# Altium footprint library Circuitos Integrados.PcbLib: 81 footprints (part 2 of 6)
Each footprint in its own frame and in the unit in brackets; x right, y up, seen from the top. Pads: shape width x height; smd on the part's side, far side on the other; paste and mask are expansions set on the pad; w line width, h text height; cw(c..) or ccw(c..) is an arc to the next point about the centre after c.
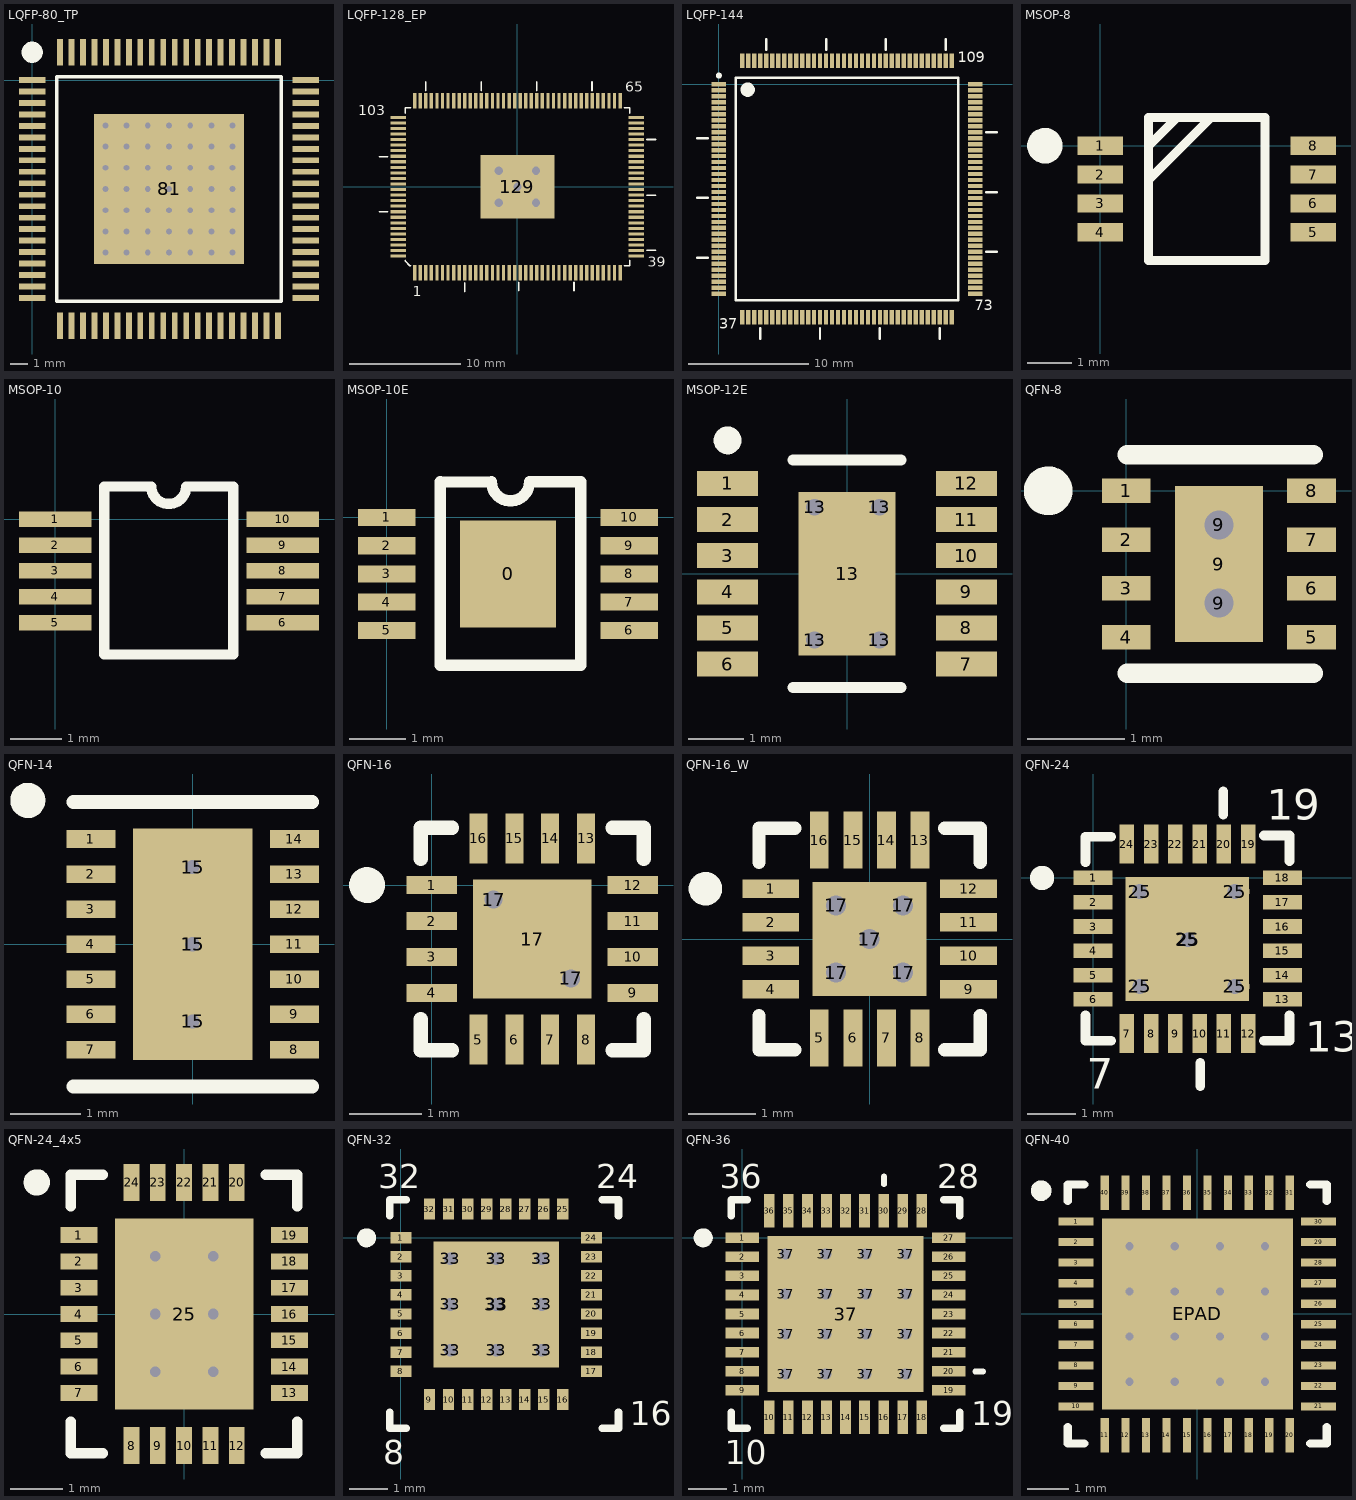
[diagram p1: the footprints below, top view; thin cyan lines are the x and y axes]

## LQFP-80_TP [mm] "LQFP, 80-Leads, Body 16,3x16,3mm (max), Pitch 0,65mm, IPC Medium Density"
height 1.6
pads (81):
  rect 1.5x0.33 smd: 1(0,0) 2(0,-0.65) 3(0,-1.3) 4(0,-1.95) 5(0,-2.6) 6(0,-3.25) 7(0,-3.9) 8(0,-4.55) 9(0,-5.2) 10(0,-5.85) 11(0,-6.5) 12(0,-7.15) 13(0,-7.8) 14(0,-8.45) 15(0,-9.1) 16(0,-9.75) 17(0,-10.4) 18(0,-11.05) 19(0,-11.7) 20(0,-12.35) 41(15.5,-12.35) 42(15.5,-11.7) 43(15.5,-11.05) 44(15.5,-10.4) 45(15.5,-9.75) 46(15.5,-9.1) 47(15.5,-8.45) 48(15.5,-7.8) 49(15.5,-7.15) 50(15.5,-6.5) 51(15.5,-5.85) 52(15.5,-5.2) 53(15.5,-4.55) 54(15.5,-3.9) 55(15.5,-3.25) 56(15.5,-2.6) 57(15.5,-1.95) 58(15.5,-1.3) 59(15.5,-0.65) 60(15.5,0)
  rect 0.33x1.5 smd: 21(1.575,-13.925) 22(2.225,-13.925) 23(2.875,-13.925) 24(3.525,-13.925) 25(4.175,-13.925) 26(4.825,-13.925) 27(5.475,-13.925) 28(6.125,-13.925) 29(6.775,-13.925) 30(7.425,-13.925) 31(8.075,-13.925) 32(8.725,-13.925) 33(9.375,-13.925) 34(10.025,-13.925) 35(10.675,-13.925) 36(11.325,-13.925) 37(11.975,-13.925) 38(12.625,-13.925) 39(13.275,-13.925) 40(13.925,-13.925) 61(13.925,1.575) 62(13.275,1.575) 63(12.625,1.575) 64(11.975,1.575) 65(11.325,1.575) 66(10.675,1.575) 67(10.025,1.575) 68(9.375,1.575) 69(8.725,1.575) 70(8.075,1.575) 71(7.425,1.575) 72(6.775,1.575) 73(6.125,1.575) 74(5.475,1.575) 75(4.825,1.575) 76(4.175,1.575) 77(3.525,1.575) 78(2.875,1.575) 79(2.225,1.575) 80(1.575,1.575)
  rect 8.5x8.5 smd paste-100: 81(7.75,-6.175)
via 11.35,-9.775 diameter 0.66 hole 0.33
via 10.15,-9.775 diameter 0.66 hole 0.33
via 8.95,-9.775 diameter 0.66 hole 0.33
via 7.75,-9.775 diameter 0.66 hole 0.33
via 6.55,-9.775 diameter 0.66 hole 0.33
via 5.35,-9.775 diameter 0.66 hole 0.33
via 4.15,-9.775 diameter 0.66 hole 0.33
via 11.35,-8.575 diameter 0.66 hole 0.33
via 10.15,-8.575 diameter 0.66 hole 0.33
via 8.95,-8.575 diameter 0.66 hole 0.33
via 7.75,-8.575 diameter 0.66 hole 0.33
via 6.55,-8.575 diameter 0.66 hole 0.33
via 5.35,-8.575 diameter 0.66 hole 0.33
via 4.15,-8.575 diameter 0.66 hole 0.33
via 11.35,-7.375 diameter 0.66 hole 0.33
via 10.15,-7.375 diameter 0.66 hole 0.33
via 8.95,-7.375 diameter 0.66 hole 0.33
via 7.75,-7.375 diameter 0.66 hole 0.33
via 6.55,-7.375 diameter 0.66 hole 0.33
via 5.35,-7.375 diameter 0.66 hole 0.33
via 4.15,-7.375 diameter 0.66 hole 0.33
via 11.35,-6.175 diameter 0.66 hole 0.33
via 10.15,-6.175 diameter 0.66 hole 0.33
via 8.95,-6.175 diameter 0.66 hole 0.33
via 7.75,-6.175 diameter 0.66 hole 0.33
via 6.55,-6.175 diameter 0.66 hole 0.33
via 5.35,-6.175 diameter 0.66 hole 0.33
via 4.15,-6.175 diameter 0.66 hole 0.33
via 11.35,-4.975 diameter 0.66 hole 0.33
via 10.15,-4.975 diameter 0.66 hole 0.33
via 8.95,-4.975 diameter 0.66 hole 0.33
via 7.75,-4.975 diameter 0.66 hole 0.33
via 6.55,-4.975 diameter 0.66 hole 0.33
via 5.35,-4.975 diameter 0.66 hole 0.33
via 4.15,-4.975 diameter 0.66 hole 0.33
via 11.35,-3.775 diameter 0.66 hole 0.33
via 10.15,-3.775 diameter 0.66 hole 0.33
via 8.95,-3.775 diameter 0.66 hole 0.33
via 7.75,-3.775 diameter 0.66 hole 0.33
via 6.55,-3.775 diameter 0.66 hole 0.33
via 5.35,-3.775 diameter 0.66 hole 0.33
via 4.15,-3.775 diameter 0.66 hole 0.33
via 11.35,-2.575 diameter 0.66 hole 0.33
via 10.15,-2.575 diameter 0.66 hole 0.33
via 8.95,-2.575 diameter 0.66 hole 0.33
via 7.75,-2.575 diameter 0.66 hole 0.33
via 6.55,-2.575 diameter 0.66 hole 0.33
via 5.35,-2.575 diameter 0.66 hole 0.33
via 4.15,-2.575 diameter 0.66 hole 0.33
Top Overlay:
  circle w0.6: c0,1.575 r0.3
  lines w0.2: 1.4,-12.525 14.1,-12.525 14.1,0.175 1.4,0.175 1.4,-12.525
Top Paste:
  rectangle: 8.95,-9.775 11.35,-7.375
  rectangle: 4.15,-9.775 6.55,-7.375
  rectangle: 6.55,-7.375 8.95,-4.975
  rectangle: 8.95,-4.975 11.35,-2.575
  rectangle: 4.15,-4.975 6.55,-2.575
3D body "LQFP-80 14x14.STEP": height 1.6, standoff 0.01, extent -0.254,-14.177 15.755,1.832

## LQFP-128_EP [mil]
height 62.99
pads (129):
  rect 12x55 smd: 1(-364.5,-304.5) 2(-344.8,-304.5) 3(-325.1,-304.5) 4(-305.4,-304.5) 5(-285.7,-304.5) 6(-266,-304.5) 7(-246.3,-304.5) 8(-226.6,-304.5) 9(-206.9,-304.5) 10(-187.2,-304.5) 11(-167.5,-304.5) 12(-147.8,-304.5) 13(-128.1,-304.5) 14(-108.4,-304.5) 15(-88.7,-304.5) 16(-69,-304.5) 17(-49.3,-304.5) 18(-29.6,-304.5) 19(-9.9,-304.5) 20(9.8,-304.5) 21(29.5,-304.5) 22(49.2,-304.5) 23(68.9,-304.5) 24(88.6,-304.5) 25(108.3,-304.5) 26(128,-304.5) 27(147.7,-304.5) 28(167.4,-304.5) 29(187.1,-304.5) 30(206.8,-304.5) 31(226.5,-304.5) 32(246.2,-304.5) 33(265.9,-304.5) 34(285.6,-304.5) 35(305.3,-304.5) 36(325,-304.5) 37(344.7,-304.5) 38(364.4,-304.5) 65(364.4,304.5) 66(344.7,304.5) 67(325,304.5) 68(305.3,304.5) 69(285.6,304.5) 70(265.9,304.5) 71(246.2,304.5) 72(226.5,304.5) 73(206.8,304.5) 74(187.1,304.5) 75(167.4,304.5) 76(147.7,304.5) 77(128,304.5) 78(108.3,304.5) 79(88.6,304.5) 80(68.9,304.5) 81(49.2,304.5) 82(29.5,304.5) 83(9.8,304.5) 84(-9.9,304.5) 85(-29.6,304.5) 86(-49.3,304.5) 87(-69,304.5) 88(-88.7,304.5) 89(-108.4,304.5) 90(-128.1,304.5) 91(-147.8,304.5) 92(-167.5,304.5) 93(-187.2,304.5) 94(-206.9,304.5) 95(-226.6,304.5) 96(-246.3,304.5) 97(-266,304.5) 98(-285.7,304.5) 99(-305.4,304.5) 100(-325.1,304.5) 101(-344.8,304.5) 102(-364.5,304.5)
  rect 55x11 smd: 39(422.5,-246.3) 40(422.5,-226.6) 41(422.5,-206.9) 42(422.5,-187.2) 43(422.5,-167.5) 44(422.5,-147.8) 45(422.5,-128.1) 46(422.5,-108.4) 47(422.5,-88.7) 48(422.5,-69) 49(422.5,-49.3) 50(422.5,-29.6) 51(422.5,-9.9) 52(422.5,9.8) 53(422.5,29.5) 54(422.5,49.2) 55(422.5,68.9) 56(422.5,88.6) 57(422.5,108.3) 58(422.5,128) 59(422.5,147.7) 60(422.5,167.4) 61(422.5,187.1) 62(422.5,206.8) 63(422.5,226.5) 64(422.5,246.2) 103(-422.5,246.2) 104(-422.5,226.5) 105(-422.5,206.8) 106(-422.5,187.1) 107(-422.5,167.4) 108(-422.5,147.7) 109(-422.5,128) 110(-422.5,108.3) 111(-422.5,88.6) 112(-422.5,68.9) 113(-422.5,49.2) 114(-422.5,29.5) 115(-422.5,9.8) 116(-422.5,-9.9) 117(-422.5,-29.6) 118(-422.5,-49.3) 119(-422.5,-69) 120(-422.5,-88.7) 121(-422.5,-108.4) 122(-422.5,-128.1) 123(-422.5,-147.8) 124(-422.5,-167.5) 125(-422.5,-187.2) 126(-422.5,-206.9) 127(-422.5,-226.6) 128(-422.5,-246.3)
  rect 264x226 smd paste-39370.1: 129(0,0)
via 0,0 diameter 39.37 hole 29.53
via -66,-56.5 diameter 39.37 hole 29.53
via -66,56.5 diameter 39.37 hole 29.53
via 66,-56.5 diameter 39.37 hole 29.53
via 66,56.5 diameter 39.37 hole 29.53
Top Overlay:
  lines w6: -491,-89 -461,-89 ; -490,107 -460,107 ; -398.7,-261 -398.7,-263.5 -381.7,-280.5 -379,-280.5 ; -398.7,261 -398.7,280.5 -379,280.5 ; -325,342 -325,372 ; -187,-372 -187,-342 ; -128,342 -128,372 ; 5,-369.76 5,-339.76 ; 69,342 69,372 ; 201,-368.76 201,-338.76 ; 265,342 265,372 ; 379,-280.5 398.7,-280.5 398.7,-261 ; 379,280.5 398.7,280.5 398.7,261 ; 460,-225 490,-225 ; 460,168 490,168 ; 460.1,-29.9 490.1,-29.9
  text "103" at -566,253 h36
  text "65" at 382,337 h36
  text "39" at 463,-284 h36
  text "1" at -372,-389 h36
Top Paste:
  region: -130,-5 -130,-110 -5,-110 -5,-5
  region: 5,-5 5,-110 130,-110 130,-5
  region: -130,5 -130,110 -5,110 -5,5
  region: 5,110 5,5 130,5 130,110
3D body "User Library-LQFP-144-1.STEP": height 62.99, standoff 1.98, extent -433,-315 441.6,323.28

## LQFP-144 [mm] "TSQFP, 144-Leads, Body 22,2x22,2mm (max), Pitch 0,50mm, IPC Medium Density"
height 1.6
pads (144):
  rect 1.2x0.36 smd: 1(0,0) 2(0,-0.5) 3(0,-1) 4(0,-1.5) 5(0,-2) 6(0,-2.5) 7(0,-3) 8(0,-3.5) 9(0,-4) 10(0,-4.5) 11(0,-5) 12(0,-5.5) 13(0,-6) 14(0,-6.5) 15(0,-7) 16(0,-7.5) 17(0,-8) 18(0,-8.5) 19(0,-9) 20(0,-9.5) 21(0,-10) 22(0,-10.5) 23(0,-11) 24(0,-11.5) 25(0,-12) 26(0,-12.5) 27(0,-13) 28(0,-13.5) 29(0,-14) 30(0,-14.5) 31(0,-15) 32(0,-15.5) 33(0,-16) 34(0,-16.5) 35(0,-17) 36(0,-17.5) 73(21.41,-17.5) 74(21.41,-17) 75(21.41,-16.5) 76(21.41,-16) 77(21.41,-15.5) 78(21.41,-15) 79(21.41,-14.5) 80(21.41,-14) 81(21.41,-13.5) 82(21.41,-13) 83(21.41,-12.5) 84(21.41,-12) 85(21.41,-11.5) 86(21.41,-11) 87(21.41,-10.5) 88(21.41,-10) 89(21.41,-9.5) 90(21.41,-9) 91(21.41,-8.5) 92(21.41,-8) 93(21.41,-7.5) 94(21.41,-7) 95(21.41,-6.5) 96(21.41,-6) 97(21.41,-5.5) 98(21.41,-5) 99(21.41,-4.5) 100(21.41,-4) 101(21.41,-3.5) 102(21.41,-3) 103(21.41,-2.5) 104(21.41,-2) 105(21.41,-1.5) 106(21.41,-1) 107(21.41,-0.5) 108(21.41,0)
  rect 0.36x1.2 smd: 37(1.955,-19.455) 38(2.455,-19.455) 39(2.955,-19.455) 40(3.455,-19.455) 41(3.955,-19.455) 42(4.455,-19.455) 43(4.955,-19.455) 44(5.455,-19.455) 45(5.955,-19.455) 46(6.455,-19.455) 47(6.955,-19.455) 48(7.455,-19.455) 49(7.955,-19.455) 50(8.455,-19.455) 51(8.955,-19.455) 52(9.455,-19.455) 53(9.955,-19.455) 54(10.455,-19.455) 55(10.955,-19.455) 56(11.455,-19.455) 57(11.955,-19.455) 58(12.455,-19.455) 59(12.955,-19.455) 60(13.455,-19.455) 61(13.955,-19.455) 62(14.455,-19.455) 63(14.955,-19.455) 64(15.455,-19.455) 65(15.955,-19.455) 66(16.455,-19.455) 67(16.955,-19.455) 68(17.455,-19.455) 69(17.955,-19.455) 70(18.455,-19.455) 71(18.955,-19.455) 72(19.455,-19.455) 109(19.455,1.955) 110(18.955,1.955) 111(18.455,1.955) 112(17.955,1.955) 113(17.455,1.955) 114(16.955,1.955) 115(16.455,1.955) 116(15.955,1.955) 117(15.455,1.955) 118(14.955,1.955) 119(14.455,1.955) 120(13.955,1.955) 121(13.455,1.955) 122(12.955,1.955) 123(12.455,1.955) 124(11.955,1.955) 125(11.455,1.955) 126(10.955,1.955) 127(10.455,1.955) 128(9.955,1.955) 129(9.455,1.955) 130(8.955,1.955) 131(8.455,1.955) 132(7.955,1.955) 133(7.455,1.955) 134(6.955,1.955) 135(6.455,1.955) 136(5.955,1.955) 137(5.455,1.955) 138(4.955,1.955) 139(4.455,1.955) 140(3.955,1.955) 141(3.455,1.955) 142(2.955,1.955) 143(2.455,1.955) 144(1.955,1.955)
Top Overlay:
  circle w0.25: c0,0.73 r0.125
  circle w0.6: c2.405,-0.45 r0.3
  lines w0.2: 1.405,-18.05 1.405,0.55 20.005,0.55 20.005,-18.05 1.405,-18.05
  lines w0.203: -1.829,-14.496 -0.94,-14.496 ; -1.829,-9.496 -0.94,-9.496 ; -1.829,-4.496 -0.94,-4.496 ; 3.451,-21.284 3.451,-20.395 ; 3.959,2.895 3.959,3.784 ; 8.451,-21.284 8.451,-20.395 ; 8.959,2.895 8.959,3.784 ; 13.451,-21.284 13.451,-20.395 ; 13.959,2.895 13.959,3.784 ; 18.451,-21.284 18.451,-20.395 ; 18.959,2.895 18.959,3.784 ; 22.35,-14.004 23.239,-14.004 ; 22.35,-9.004 23.239,-9.004 ; 22.35,-4.004 23.239,-4.004
  text "37" at 0.025,-20.447 h0.89
  text "73" at 21.361,-18.898 h0.89
  text "109" at 19.964,1.854 h0.89
3D body "SW3dPS-LQFP-144.STEP": height 1.69, standoff -0.01, extent -0.293,-19.754 21.71,2.248

## MSOP-8 [mm]
pads (8):
  rect 1.02x0.41 smd: 1(0,0) 2(0,-0.65) 3(0,-1.3) 4(0,-1.95) 5(4.8,-1.95) 6(4.8,-1.3) 7(4.8,-0.65) 8(4.8,0)
Top Overlay:
  circle w0.4: c-1.25,0 r0.2
  lines w0.203: 1.089,-0.762 2.486,0.635 ; 1.114,0.025 1.724,0.635 ; 1.089,-2.585 1.089,0.635 3.708,0.635 3.708,-2.585 1.089,-2.585
3D body "User Library-EMSOP-8 Natl Semi MUY08A.STEP": height 1.09, standoff -0.01, extent -0.112,-2.492 4.888,0.508

## MSOP-10 [mm]
pads (10):
  rect 1.4x0.3 smd: 1(0,0) 2(0,-0.5) 3(0,-1) 4(0,-1.5) 5(0,-2) 6(4.4,-2) 7(4.4,-1.5) 8(4.4,-1) 9(4.4,-0.5) 10(4.4,0)
Top Overlay:
  lines w0.2: 0.949,0.61 0.949,-2.616 3.439,-2.616 3.439,0.61 ; 0.949,0.631 1.857,0.63 ; 1.858,0.631 ccw(c2.194,0.631) 2.531,0.631 ; 2.53,0.632 3.439,0.631
3D body "User Library-msop-10.STEP": height 1.15, standoff 0, extent -0.24,-2.492 4.66,0.508

## MSOP-10E [mil] "TSOP, 10-Leads, Pitch 0,5mm, Exp PAD, IPC Medium Density"
pads (11):
  rect 66.93x74.8 smd: 0(84.65,-39.37)
  rect 40x12 smd: 1(0,0) 2(0,-19.68) 3(0,-39.37) 4(0,-59.05) 5(0,-78.74) 6(169.29,-78.74) 7(169.29,-59.05) 8(169.29,-39.37) 9(169.29,-19.68) 10(169.29,0)
Top Overlay:
  lines w7.87: 37.38,24 37.38,-103 135.41,-103 135.41,24 ; 37.38,24.84 73.1,24.8 ; 73.14,24.84 ccw(c86.39,24.84) 99.65,24.84 ; 99.6,24.9 135.41,24.84
3D body "User Library-msop-10.STEP": height 45.28, standoff 0, extent -11.81,-98.42 181.1,19.69

## MSOP-12E [mm] "TSOP, 12-Leads, Body 4,1x3,1mm (max), Pitch 0,65mm, Exp PAD, IPC Medium Density"
height 1.1
pads (17):
  rect 1.1x0.45 smd mask+0.076: 1(-2.15,1.625) 2(-2.15,0.975) 3(-2.15,0.325) 4(-2.15,-0.325) 5(-2.15,-0.975) 6(-2.15,-1.625) 7(2.15,-1.625) 8(2.15,-0.975) 9(2.15,-0.325) 10(2.15,0.325) 11(2.15,0.975) 12(2.15,1.625)
  round 0.5 hole 0.3: 13(-0.584,-1.194) 13(-0.584,1.194) 13(0.584,-1.194) 13(0.584,1.194)
  rect 1.75x2.95 smd paste-200 mask+0.076: 13(0,0)
Top Overlay:
  circle w0.25: c-2.15,2.4 r0.125
  lines w0.2: -0.975,-2.05 0.975,-2.05 ; -0.975,2.05 0.975,2.05
Top Paste:
  rectangle: -0.584,-0.94 0.584,0.94
3D body "User Library-msop-12.STEP": height 1.1, standoff 0, extent -2.475,-2.008 2.425,2.032

## QFN-8 [mm] "QFN, 8-Leads, Body 2,1x2,1mm (max), Pitch 0,50mm, IPC Medium Density"
height 0.8
pads (11):
  rect 0.5x0.25 smd mask+0.07: 1(0,0) 2(0,-0.5) 3(0,-1) 4(0,-1.5) 5(1.9,-1.5) 6(1.9,-1) 7(1.9,-0.5) 8(1.9,0)
  round 0.508 hole 0.3: 9(0.95,-1.15) 9(0.95,-0.35)
  rect 0.9x1.6 smd paste-0.12 mask+0.07: 9(0.95,-0.75)
Top Overlay:
  circle w0.25: c-0.8,0 r0.125
  lines w0.2: 0.01,-1.868 1.915,-1.868 ; 0.01,0.368 1.915,0.368
3D body: height 0.8, standoff 0.05, extent -0.038,-1.753 1.968,0.254

## QFN-14 [mm] "QFN, 14-Leads, Body 4,00x3,00mm, Pitch 0,50mm, Thermal Pad 3,30x1,70mm, IPC Medium Density"
height 1
pads (18):
  rect 0.7x0.25 smd: 1(-1.45,1.5) 2(-1.45,1) 3(-1.45,0.5) 4(-1.45,0) 5(-1.45,-0.5) 6(-1.45,-1) 7(-1.45,-1.5) 8(1.45,-1.5) 9(1.45,-1) 10(1.45,-0.5) 11(1.45,0) 12(1.45,0.5) 13(1.45,1) 14(1.45,1.5)
  round 0.5 hole 0.2: 15(0,-1.1) 15(0,0) 15(0,1.1)
  rect 1.7x3.3 smd: 15(0,0)
Top Overlay:
  circle w0.25: c-2.35,2.05 r0.125
  lines w0.2: -1.7,-2.025 1.7,-2.025 ; -1.7,2.025 1.7,2.025
3D body: height 1, standoff 0, extent -1.5,-2 1.5,2

## QFN-16 [mm] "QFN, 16-Leads, Body 3.0x3.0mm (max), Pitch 0.50mm, IPC Medium Density"
height 0.9
pads (19):
  rect 0.7x0.25 smd: 1(0,0) 2(0,-0.5) 3(0,-1) 4(0,-1.5) 9(2.8,-1.5) 10(2.8,-1) 11(2.8,-0.5) 12(2.8,0)
  rect 0.25x0.7 smd: 5(0.65,-2.15) 6(1.15,-2.15) 7(1.65,-2.15) 8(2.15,-2.15) 13(2.15,0.65) 14(1.65,0.65) 15(1.15,0.65) 16(0.65,0.65)
  round 0.559 hole 0.25: 17(0.864,-0.203) 17(1.936,-1.297)
  rect 1.65x1.65 smd paste-0.381: 17(1.4,-0.75)
Top Overlay:
  circle w0.25: c-0.9,0 r0.125
  lines w0.2: -0.15,-1.868 -0.15,-2.3 0.282,-2.3 ; -0.15,0.368 -0.15,0.8 0.282,0.8 ; 2.518,-2.3 2.95,-2.3 2.95,-1.868 ; 2.518,0.8 2.95,0.8 2.95,0.368
3D body "User Library-QFN-16_3x3.STEP": height 0.9, standoff 0, extent -0.127,-2.283 2.915,0.759

## QFN-16_W [mm] "QFN, 16-Leads, Body 3,3x3,3mm (max), Pitch 0,50mm, IPC Medium Density"
height 0.8
pads (22):
  rect 0.85x0.28 smd mask+0.076: 1(-1.475,0.75) 2(-1.475,0.25) 3(-1.475,-0.25) 4(-1.475,-0.75) 9(1.475,-0.75) 10(1.475,-0.25) 11(1.475,0.25) 12(1.475,0.75)
  rect 0.28x0.85 smd mask+0.076: 5(-0.75,-1.475) 6(-0.25,-1.475) 7(0.25,-1.475) 8(0.75,-1.475) 13(0.75,1.475) 14(0.25,1.475) 15(-0.25,1.475) 16(-0.75,1.475)
  round 0.559 hole 0.3: 17(-0.5,-0.5) 17(-0.5,0.5) 17(0,0) 17(0.5,-0.5) 17(0.5,0.5)
  rect 1.7x1.7 smd paste-100 mask+0.076: 17(0,0)
Top Overlay:
  circle w0.25: c-2.45,0.75 r0.125
  lines w0.2: -1.65,-1.143 -1.65,-1.65 -1.118,-1.65 ; -1.65,1.143 -1.65,1.65 -1.118,1.65 ; 1.118,-1.65 1.65,-1.65 1.65,-1.143 ; 1.118,1.65 1.65,1.65 1.65,1.143
Top Paste:
  rectangle: 0.1,0.1 0.8,0.8
  region: -0.1,0.8 -0.8,0.8 -0.8,0.1 -0.1,0.1
  region: -0.1,-0.1 -0.8,-0.1 -0.8,-0.8 -0.1,-0.8
  rectangle: 0.1,-0.8 0.8,-0.1
3D body: height 0.8, standoff 0.08, extent -1.65,-1.65 1.65,1.65

## QFN-24 [mm] "QFN, 24-Leads, Body 4,1x4,1mm (max), Pitch 0,50mm, IPC Low Density"
height 0.8
pads (30):
  rect 0.8x0.3 smd mask+0.07: 1(0,0) 2(0,-0.5) 3(0,-1) 4(0,-1.5) 5(0,-2) 6(0,-2.5) 13(3.9,-2.5) 14(3.9,-2) 15(3.9,-1.5) 16(3.9,-1) 17(3.9,-0.5) 18(3.9,0)
  rect 0.3x0.8 smd mask+0.07: 7(0.696,-3.204) 8(1.196,-3.204) 9(1.696,-3.204) 10(2.196,-3.204) 11(2.696,-3.204) 12(3.196,-3.204) 19(3.196,0.696) 20(2.696,0.696) 21(2.196,0.696) 22(1.696,0.696) 23(1.196,0.696) 24(0.696,0.696)
  round 0.6 hole 0.3 mask+0.07: 25(0.965,-2.235) 25(0.965,-0.279) 25(1.956,-1.27) 25(2.921,-2.235) 25(2.921,-0.279)
  rect 2.55x2.55 smd paste-200 mask+0.07: 25(1.941,-1.26)
Top Overlay:
  circle w0.25: c-1.05,0 r0.125
  lines w0.2: -0.155,-2.826 -0.155,-3.351 0.37,-3.351 ; -0.155,0.326 -0.155,0.851 0.37,0.851 ; 2.21,-4.293 2.21,-3.81 ; 2.682,1.302 2.682,1.785 ; 3.522,-3.351 4.047,-3.351 4.047,-2.826 ; 3.522,0.876 4.047,0.876 4.047,0.351
  text "7" at -0.127,-4.343 h0.64
  text "13" at 4.369,-3.581 h0.64
  text "19" at 3.581,1.194 h0.64
Top Paste:
  rectangle: 2.088,-2.393 3.088,-1.393
  region: 0.838,-1.393 0.838,-2.393 1.838,-2.393 1.838,-1.393
  rectangle: 2.088,-1.143 3.088,-0.143
  rectangle: 0.838,-1.143 1.838,-0.143
3D body "User Library-QFN24_4x4.STEP": height 1, standoff 0, extent -0.069,-3.273 3.951,0.747

## QFN-24_4x5 [mm] "24-pin QFN 4x5mm"
height 1
pads (25):
  rect 0.7x0.3 smd: 1(-2,1.5) 2(-2,1) 3(-2,0.5) 4(-2,0) 5(-2,-0.5) 6(-2,-1) 7(-2,-1.5) 13(2,-1.5) 14(2,-1) 15(2,-0.5) 16(2,0) 17(2,0.5) 18(2,1) 19(2,1.5)
  rect 0.3x0.7 smd: 8(-1,-2.5) 9(-0.5,-2.5) 10(0,-2.5) 11(0.5,-2.5) 12(1,-2.5) 20(1,2.5) 21(0.5,2.5) 22(0,2.5) 23(-0.5,2.5) 24(-1,2.5)
  rect 2.63x3.63 smd: 25(0,0)
via 0.55,-1.1 diameter 0.5 hole 0.2
via -0.55,-1.1 diameter 0.5 hole 0.2
via 0.55,0 diameter 0.5 hole 0.2
via -0.55,0 diameter 0.5 hole 0.2
via 0.55,1.1 diameter 0.5 hole 0.2
via -0.55,1.1 diameter 0.5 hole 0.2
Top Overlay:
  circle w0.25: c-2.8,2.5 r0.125
  lines w0.2: -2.15,-2.05 -2.15,-2.65 -1.55,-2.65 ; -2.15,2.05 -2.15,2.65 -1.55,2.65 ; 1.55,-2.65 2.15,-2.65 2.15,-2.05 ; 1.55,2.65 2.15,2.65 2.15,2.05
3D body: height 1, standoff 0, extent -2,-2.5 2,2.5

## QFN-32 [mm]
height 0.8
pads (42):
  rect 0.55x0.3 smd: 1(0,0) 2(0,-0.5) 3(0,-1) 4(0,-1.5) 5(0,-2) 6(0,-2.5) 7(0,-3) 8(0,-3.5) 17(5,-3.5) 18(5,-3) 19(5,-2.5) 20(5,-2) 21(5,-1.5) 22(5,-1) 23(5,-0.5) 24(5,0)
  rect 0.3x0.55 smd: 9(0.75,-4.25) 10(1.25,-4.25) 11(1.75,-4.25) 12(2.25,-4.25) 13(2.75,-4.25) 14(3.25,-4.25) 15(3.75,-4.25) 16(4.25,-4.25) 25(4.25,0.75) 26(3.75,0.75) 27(3.25,0.75) 28(2.75,0.75) 29(2.25,0.75) 30(1.75,0.75) 31(1.25,0.75) 32(0.75,0.75)
  round 0.66 hole 0.33: 33(1.3,-2.95) 33(1.3,-1.75) 33(1.3,-0.55) 33(2.5,-2.95) 33(2.5,-1.75) 33(2.5,-0.55) 33(3.7,-2.95) 33(3.7,-1.75) 33(3.7,-0.55)
  rect 3.3x3.3 smd paste-200: 33(2.5,-1.75)
Top Overlay:
  circle w0.25: c-0.9,0 r0.125
  lines w0.2: -0.29,-4.575 -0.29,-5 0.135,-5 ; -0.29,0.575 -0.29,1 0.135,1 ; 5.285,-5 5.71,-5 5.71,-4.575 ; 5.285,1 5.71,1 5.71,0.575
  text "8" at -0.465,-5.937 h0.64
  text "16" at 6.012,-4.921 h0.64
  text "24" at 5.123,1.302 h0.64
  text "32" at -0.592,1.302 h0.64
Top Paste:
  rectangle: 1.45,-1.65 2.375,-0.725
  rectangle: 2.65,-1.65 3.575,-0.725
  rectangle: 2.65,-2.85 3.575,-1.925
  rectangle: 1.45,-2.85 2.375,-1.925
3D body "User Library-qfn32-5x5.STEP": height 0.8, standoff 0, extent -0.02,-4.26 5,0.76

## QFN-36 [mm] "36-Pin Quad Flat No-lead (QFN)"
height 0.9
pads (53):
  rect 0.89x0.28 smd mask+0.07: 1(0,0) 2(0,-0.5) 3(0,-1) 4(0,-1.5) 5(0,-2) 6(0,-2.5) 7(0,-3) 8(0,-3.5) 9(0,-4) 19(5.42,-4) 20(5.42,-3.5) 21(5.42,-3) 22(5.42,-2.5) 23(5.42,-2) 24(5.42,-1.5) 25(5.42,-1) 26(5.42,-0.5) 27(5.42,0)
  rect 0.28x0.89 smd mask+0.07: 10(0.71,-4.71) 11(1.21,-4.71) 12(1.71,-4.71) 13(2.21,-4.71) 14(2.71,-4.71) 15(3.21,-4.71) 16(3.71,-4.71) 17(4.21,-4.71) 18(4.71,-4.71) 28(4.71,0.71) 29(4.21,0.71) 30(3.71,0.71) 31(3.21,0.71) 32(2.71,0.71) 33(2.21,0.71) 34(1.71,0.71) 35(1.21,0.71) 36(0.71,0.71)
  round 0.559 hole 0.3: 37(1.135,-3.575) 37(1.135,-2.525) 37(1.135,-1.475) 37(1.135,-0.425) 37(2.185,-3.575) 37(2.185,-2.525) 37(2.185,-1.475) 37(2.185,-0.425) 37(3.235,-3.575) 37(3.235,-2.525) 37(3.235,-1.475) 37(3.235,-0.425) 37(4.285,-3.575) 37(4.285,-2.525) 37(4.285,-1.475) 37(4.285,-0.425)
  rect 4.1x4.1 smd paste-200 mask+0.07: 37(2.71,-2)
Top Overlay:
  circle w0.25: c-1.025,0 r0.125
  lines w0.152: 3.717,1.404 3.717,1.607 ; 6.114,-3.507 6.317,-3.507
  lines w0.2: -0.29,-4.575 -0.29,-5 0.135,-5 ; -0.29,0.575 -0.29,1 0.135,1 ; 5.285,-5 5.71,-5 5.71,-4.575 ; 5.285,1 5.71,1 5.71,0.575
  text "10" at -0.465,-5.937 h0.64
  text "19" at 6.012,-4.921 h0.64
  text "28" at 5.123,1.302 h0.64
  text "36" at -0.592,1.302 h0.64
Top Paste:
  rectangle: 0.742,-0.832 1.542,-0.032
  rectangle: 1.792,-0.832 2.592,-0.032
  rectangle: 2.842,-0.832 3.642,-0.032
  rectangle: 3.892,-0.832 4.692,-0.032
  rectangle: 3.892,-1.882 4.692,-1.082
  rectangle: 2.842,-1.882 3.642,-1.082
  rectangle: 1.792,-1.882 2.592,-1.082
  rectangle: 0.742,-1.882 1.542,-1.082
  rectangle: 0.742,-2.932 1.542,-2.132
  rectangle: 1.792,-2.932 2.592,-2.132
  rectangle: 2.842,-2.932 3.642,-2.132
  rectangle: 3.892,-2.932 4.692,-2.132
  rectangle: 3.892,-3.982 4.692,-3.182
  rectangle: 2.842,-3.982 3.642,-3.182
  rectangle: 1.792,-3.982 2.592,-3.182
  rectangle: 0.742,-3.982 1.542,-3.182
3D body "User Library-QFN36 (6x6).STEP": height 0.9, standoff 0.01, extent -0.381,-5.084 5.824,1.121

## QFN-40 [mm] "40-pin 6mm x 6mm QFN"
height 0.8
pads (41):
  rect 0.85x0.2 smd: 1(-2.95,2.25) 2(-2.95,1.75) 3(-2.95,1.25) 4(-2.95,0.75) 5(-2.95,0.25) 6(-2.95,-0.25) 7(-2.95,-0.75) 8(-2.95,-1.25) 9(-2.95,-1.75) 10(-2.95,-2.25) 21(2.95,-2.25) 22(2.95,-1.75) 23(2.95,-1.25) 24(2.95,-0.75) 25(2.95,-0.25) 26(2.95,0.25) 27(2.95,0.75) 28(2.95,1.25) 29(2.95,1.75) 30(2.95,2.25)
  rect 0.2x0.85 smd: 11(-2.25,-2.95) 12(-1.75,-2.95) 13(-1.25,-2.95) 14(-0.75,-2.95) 15(-0.25,-2.95) 16(0.25,-2.95) 17(0.75,-2.95) 18(1.25,-2.95) 19(1.75,-2.95) 20(2.25,-2.95) 31(2.25,2.95) 32(1.75,2.95) 33(1.25,2.95) 34(0.75,2.95) 35(0.25,2.95) 36(-0.25,2.95) 37(-0.75,2.95) 38(-1.25,2.95) 39(-1.75,2.95) 40(-2.25,2.95)
  rect 4.65x4.65 smd paste-1000: EPAD(0,0)
via 1.65,-1.65 diameter 0.5 hole 0.2
via 0.55,-1.65 diameter 0.5 hole 0.2
via -0.55,-1.65 diameter 0.5 hole 0.2
via -1.65,-1.65 diameter 0.5 hole 0.2
via 1.65,-0.55 diameter 0.5 hole 0.2
via 0.55,-0.55 diameter 0.5 hole 0.2
via -0.55,-0.55 diameter 0.5 hole 0.2
via -1.65,-0.55 diameter 0.5 hole 0.2
via 1.65,0.55 diameter 0.5 hole 0.2
via 0.55,0.55 diameter 0.5 hole 0.2
via -0.55,0.55 diameter 0.5 hole 0.2
via -1.65,0.55 diameter 0.5 hole 0.2
via 1.65,1.65 diameter 0.5 hole 0.2
via 0.55,1.65 diameter 0.5 hole 0.2
via -0.55,1.65 diameter 0.5 hole 0.2
via -1.65,1.65 diameter 0.5 hole 0.2
Top Overlay:
  circle w0.25: c-3.8,3 r0.125
  lines w0.2: -3.15,-2.75 -3.15,-3.15 -2.75,-3.15 ; -3.15,2.75 -3.15,3.15 -2.75,3.15 ; 2.75,-3.15 3.15,-3.15 3.15,-2.75 ; 2.75,3.15 3.15,3.15 3.15,2.75
Top Paste:
  rectangle: -1.65,-1.65 -0.55,-0.55
  rectangle: -1.65,0.55 -0.55,1.65
  rectangle: 0.55,0.55 1.65,1.65
  rectangle: 0.55,-1.65 1.65,-0.55
  rectangle: -0.55,-0.55 0.55,0.55
  rectangle: 1.651,-0.516 2.311,0.584
  region: 0.516,1.651 0.516,2.311 -0.584,2.311 -0.584,1.651
  region: -0.584,-1.651 -0.584,-2.311 0.516,-2.311 0.516,-1.651
  region: -1.651,0.584 -2.311,0.584 -2.311,-0.516 -1.651,-0.516
  region: -1.651,2.311 -2.311,2.311 -2.311,1.616 -1.651,1.616
  rectangle: 1.651,1.616 2.311,2.311
  rectangle: 1.651,-2.311 2.311,-1.616
  region: -1.651,-1.616 -2.311,-1.616 -2.311,-2.311 -1.651,-2.311
3D body "User Library-QFN40.STEP": height 0.8, standoff 0, extent -3,-3 3,3